# Altium footprint library Evaluation Board.PcbLib: 121 footprints (part 5 of 8)
Each footprint in its own frame and in the unit in brackets; x right, y up, seen from the top. Pads: shape width x height; smd on the part's side, far side on the other; paste and mask are expansions set on the pad; w line width, h text height; cw(c..) or ccw(c..) is an arc to the next point about the centre after c.
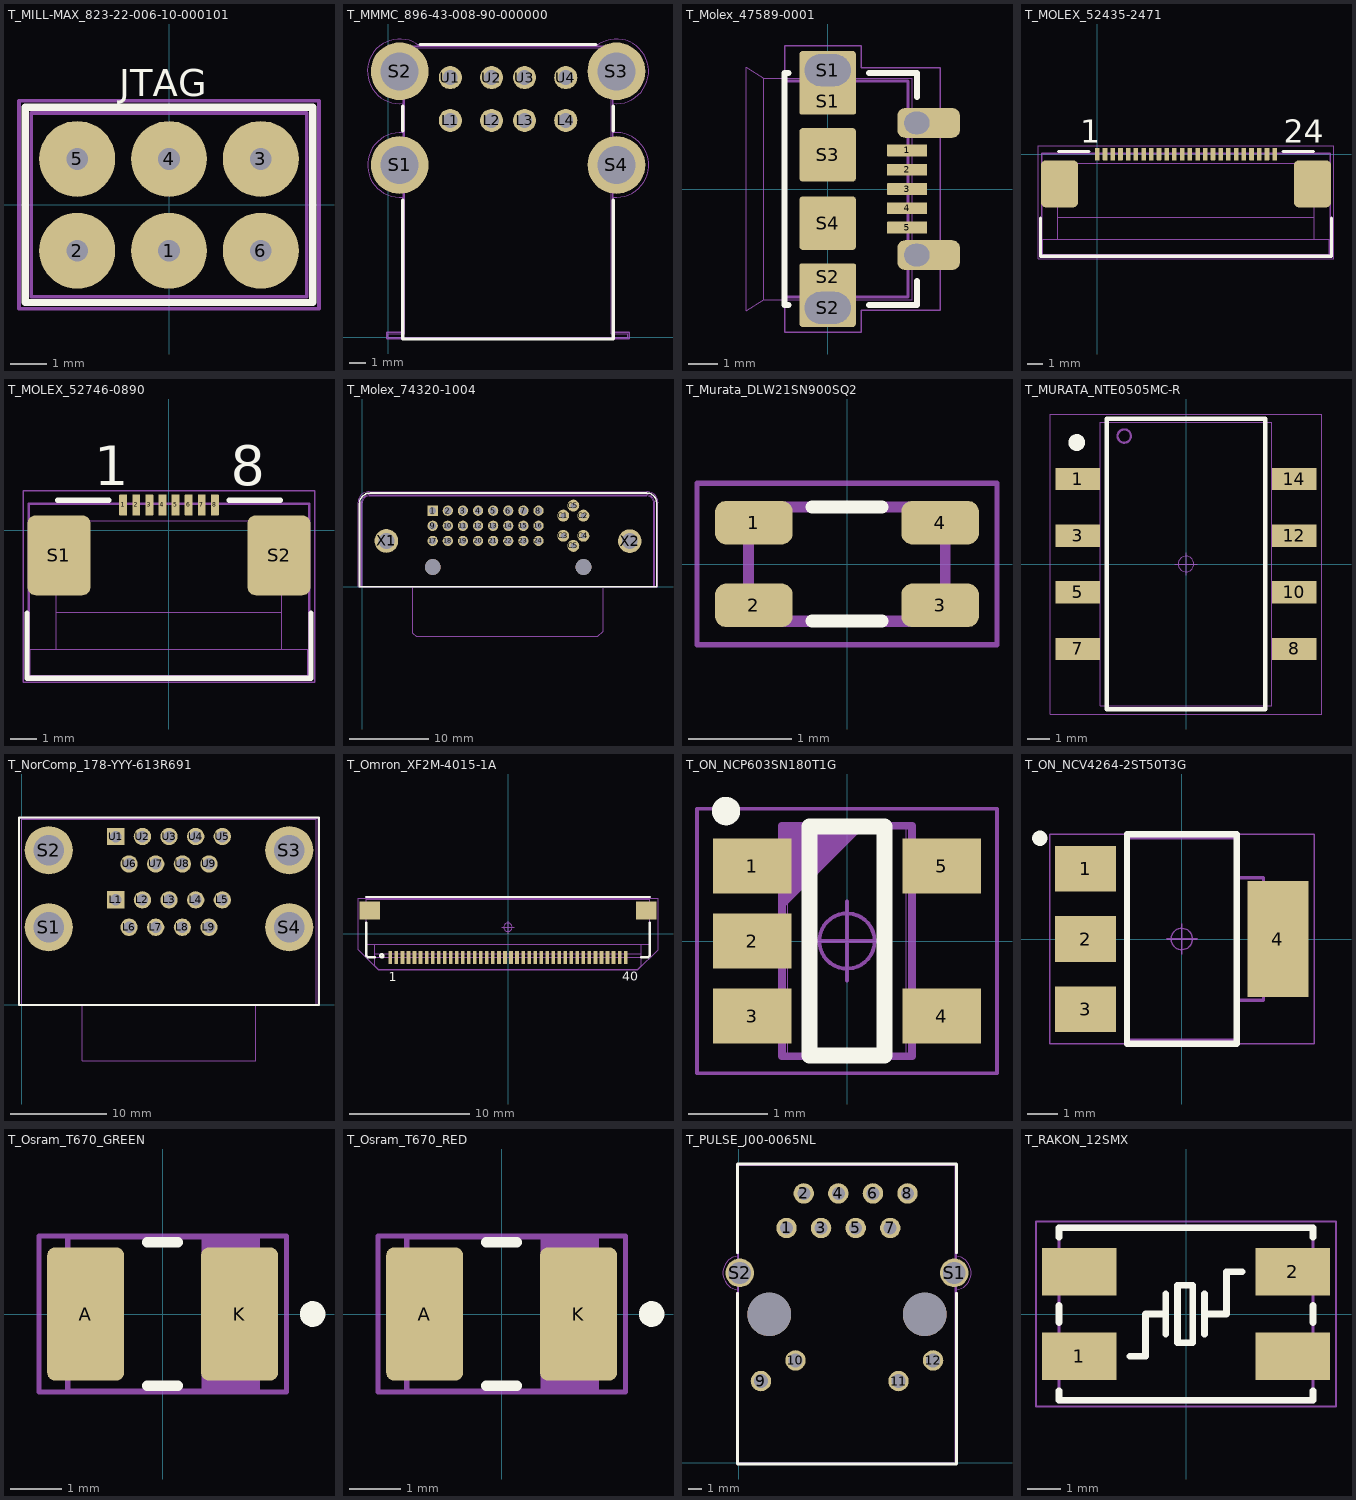
[diagram p4: the footprints below, top view; thin cyan lines are the x and y axes]

## T_MILL-MAX_823-22-006-10-000101 [mm] "Pogo Pins"
height 3.48
pads (6):
  round 2.1 hole 0.6: 1(0,-1.27) 2(-2.54,-1.27) 3(2.54,1.27) 4(0,1.27) 5(-2.54,1.27) 6(2.54,-1.27)
Top Overlay:
  lines w0.2: -3.975,-2.7 -3.975,2.7 3.975,2.7 3.975,-2.7 -3.975,-2.7
  text "JTAG" at -1.375,3 h0.75
Mechanical 1:
  lines w0.1: -4.15,-2.875 -4.15,2.875 4.15,2.875 4.15,-2.875 -4.15,-2.875
Mechanical 2:
  lines w0.001: -3.81,-2.54 -3.81,2.54 3.81,2.54 3.81,-2.54 -3.81,-2.54
Mechanical 3:
  lines w0.1: -3.81,-2.54 -3.81,2.54 3.81,2.54 3.81,-2.54 -3.81,-2.54
3D body: height 3.5, standoff -1.74, extent -3.81,-2.54 3.81,2.54

## T_MMMC_896-43-008-90-000000 [mm] "USB 2.0 double row, Type A"
height 15.6
pads (12):
  round 1.4 hole 0.9: L1(3.75,13.13) L2(6.25,13.13) L3(8.25,13.13) L4(10.75,13.13) U1(3.75,15.73) U2(6.25,15.73) U3(8.25,15.73) U4(10.75,15.73)
  round 3.5 hole 2.3: S1(0.68,10.43) S2(0.68,16.11) S3(13.82,16.11) S4(13.82,10.43)
Top Overlay:
  lines w0.2: 0.875,8.3 0.875,-0.12 13.625,-0.12 13.625,8.3 ; 0.875,12.5 0.875,14 ; 1.91,17.73 12.58,17.73 ; 13.625,12.5 13.625,14
Mechanical 1:
  lines w0.05: 0.901,8.484 0.901,0.299 -0.099,0.299 -0.099,-0.099 14.599,-0.099 14.599,0.299 13.599,0.299 13.599,8.485 ; 0.901,12.374 0.901,14.164 ; 0.902,8.484 cw(c0.685,10.429) 0.904,12.374 ; 0.903,14.164 cw(c0.679,16.109) 1.895,17.643 1.91,17.628 12.582,17.628 ; 12.582,17.631 cw(c13.815,16.11) 13.598,14.165 ; 13.599,12.375 13.599,14.165 ; 13.599,12.376 cw(c13.815,10.43) 13.6,8.485
Mechanical 2:
  lines w0.001: 0,0 0,0.2 1,0.2 1,17.53 13.5,17.53 13.5,0.2 14.5,0.2 14.5,0 0,0
Mechanical 3:
  lines w0.1: 0.9,0.299 0.9,17.629 13.599,17.629 13.599,0.299 14.6,0.299 14.6,-0.099 -0.099,-0.099 -0.099,0.299 0.901,0.299
3D body: height 16.17, standoff -3.58, extent -0.45,0 14.95,17.53

## T_Molex_47589-0001 [mm] "Micro USB Connector"
height 2.5
pads (13):
  rrect12% 1.35x0.4 smd: 1(2.675,1.3) 2(2.675,0.65) 3(2.675,0) 4(2.675,-0.65) 5(2.675,-1.3)
  rrect12% 1.9x0.9 smd: S1(0,2.963) S2(0,-2.963)
  rrect12% 1.9x2.1 hole 1.07 slot 1.55 at 0 deg copper offset 0,-0.4: S1(0,4)
  rrect12% 1.9x2.1 hole 1.07 slot 1.55 at 0 deg copper offset 0,0.4: S2(0,-4)
  rrect12% 1.9x1.8 smd: S3(0,1.15) S4(0,-1.15)
  rrect50% 2.1x1 hole 0.75 slot 0.85 at 0 deg copper offset 0.4,0: ""(3,-2.225) ""(3,2.225)
Top Overlay:
  lines w0.2: -1.32,-3.91 -1.45,-3.91 -1.45,3.91 -1.32,3.91 ; 1.397,-3.91 3,-3.91 3,-3.099 ; 1.397,3.91 3,3.91 ; 3.01,3.099 3.01,3.91
Mechanical 1:
  lines w0.05: -1.45,-4.83 -1.45,4.83 1.13,4.83 1.13,4.08 3.79,4.08 3.79,-4.08 1.13,-4.08 1.13,-4.83 -1.45,-4.83
Mechanical 2:
  lines w0.001: -2.15,-3.725 2.85,-3.725 2.85,3.725 -2.15,3.725 ; -2.15,-3.725 -2.15,3.725 ; -2.15,-3.725 -2.75,-4.1 -2.75,4.1 -2.15,3.725
Mechanical 3:
  lines w0.1: -1.45,-3.64 2.7,-3.64 2.7,3.64 -1.45,3.64 -1.45,-3.64
3D body: height 2.79, standoff -0.58, extent -2.75,-4.325 3.149,4.325

## T_MOLEX_52435-2471 [mm] "DVI FFC Connector 0.5mm pitch"
height 2
pads (26):
  rrect12% 0.3x0.8 smd: 1(0,0) 2(0.5,0) 3(1,0) 4(1.5,0) 5(2,0) 6(2.5,0) 7(3,0) 8(3.5,0) 9(4,0) 10(4.5,0) 11(5,0) 12(5.5,0) 13(6,0) 14(6.5,0) 15(7,0) 16(7.5,0) 17(8,0) 18(8.5,0) 19(9,0) 20(9.5,0) 21(10,0) 22(10.5,0) 23(11,0) 24(11.5,0)
  rrect25% 2.4x3.05 smd: ""(-2.45,-1.925) ""(13.95,-1.925)
Top Overlay:
  lines w0.2: -3.672,-4.125 -3.672,-6.62 15.175,-6.62 15.175,-4.125 ; -2.5,0.175 -0.55,0.175 ; 12.05,0.175 14,0.175
  text "1" at -1.1,0.75 h1.5
  text "24" at 12.1,0.75 h1.5
Mechanical 1:
  lines w0.05: -3.816,-6.766 15.316,-6.766 15.316,0.543 -3.816,0.543 -3.816,-6.766
Mechanical 2:
  lines w0.001: -2.55,-5.5 -2.55,-0.6 14.05,-0.6 14.05,-5.5 ; -2.55,-4.1 14.05,-4.1 ; -3.55,-6.5 -3.55,-5.5 15.05,-5.5 15.05,-6.5 -3.55,-6.5
Mechanical 3:
  lines w0.1: -3.61,-6.558 -3.61,0.044 15.109,0.044 15.109,-6.558 -3.61,-6.558

## T_MOLEX_52746-0890 [mm] "JTAG FFC Connector 0.5mm pitch"
height 2
pads (10):
  rrect12% 0.3x0.8 smd: 1(-1.75,0.962) 2(-1.25,0.962) 3(-0.75,0.962) 4(-0.25,0.962) 5(0.25,0.962) 6(0.75,0.962) 7(1.25,0.962) 8(1.75,0.962)
  rrect25% 2.4x3.05 smd: S1(-4.2,-0.962) S2(4.2,-0.962)
Top Overlay:
  lines w0.2: -5.422,-3.163 -5.422,-5.657 5.421,-5.657 5.421,-3.163 ; -4.25,1.137 -2.3,1.137 ; 2.3,1.137 4.25,1.137
  text "8" at 2.357,1.717 h1.5
  text "1" at -2.85,1.717 h1.5
Mechanical 1:
  lines w0.05: -5.566,-5.803 -5.566,1.506 5.566,1.506 5.566,-5.803 -5.566,-5.803
Mechanical 2:
  lines w0.001: -4.3,-4.537 -4.3,0.363 4.3,0.363 4.3,-4.537 ; -4.3,-3.137 4.3,-3.137 ; -5.3,-5.537 5.3,-5.537 5.3,-4.537 -5.3,-4.537 -5.3,-5.537
Mechanical 3:
  lines w0.1: -5.36,-5.595 5.36,-5.595 5.36,1.006 -5.36,1.006 -5.36,-5.595
3D body: height 2.02, standoff 0.02, extent -5.05,-5.037 5.05,1.363

## T_Molex_74320-1004 [mm] "DVI-Connectors"
height 12.7
pads (34):
  rect 1.3x1.3 hole 0.9: 1(8.89,9.63)
  round 1.3 hole 0.9: 2(10.8,9.63) 3(12.71,9.63) 4(14.62,9.63) 5(16.53,9.63) 6(18.44,9.63) 7(20.35,9.63) 8(22.26,9.63) 9(8.89,7.72) 10(10.8,7.72) 11(12.71,7.72) 12(14.62,7.72) 13(16.53,7.72) 14(18.44,7.72) 15(20.35,7.72) 16(22.26,7.72) 17(8.89,5.81) 18(10.8,5.81) 19(12.71,5.81) 20(14.62,5.81) 21(16.53,5.81) 22(18.44,5.81) 23(20.35,5.81) 24(22.26,5.81)
  round 1.5 hole 0.7: C1(25.39,9.01) C2(27.94,9.01) C3(25.39,6.46) C4(27.94,6.46) C5(26.665,5.185) C5(26.665,10.285)
  round 3 hole 2: X1(3.04,5.81) X2(33.79,5.785)
  round 2 hole 2 unplated paste+0 mask+0: ""(8.89,2.51) ""(27.94,2.51)
Top Overlay:
  lines w0.2: 0.978,11.866 ccw(c0.978,10.532) -0.356,10.532 -0.356,0 37.181,0 37.181,10.626 ; 0.978,11.868 35.936,11.868 cw(c35.936,10.626) 37.178,10.626
Mechanical 1:
  lines w0.05: -0.545,10.627 cw(c0.873,10.627) 0.873,12.045 ; -0.544,10.631 -0.544,0 37.36,0 37.36,10.64 ; 0.863,12.045 35.96,12.045 ; 35.942,12.044 cw(c35.942,10.626) 37.36,10.626
Mechanical 2:
  lines w0.001: 0,10.67 0,0 36.83,0 ; 0.001,10.65 cw(c0.85,10.65) 0.85,11.499 ; 0.84,11.499 35.968,11.499 cw(c35.968,10.65) 36.816,10.65 ; 6.4,0 6.4,-5.829 6.821,-6.25 29.76,-6.25 30.43,-5.581 ; 30.43,-5.581 30.43,0 ; 36.818,0.052 36.818,10.68
Mechanical 3:
  lines w0.1: -0.122,10.635 cw(c0.874,10.635) 0.874,11.63 35.923,11.63 cw(c35.923,10.604) 36.949,10.604 36.949,0 -0.119,0 -0.119,10.626
3D body: height 10.22, standoff -2.93, extent -0.335,-6.25 37.165,11.55

## T_Murata_DLW21SN900SQ2 [mm] "Common Mode Choke"
height 1.2
pads (4):
  rrect50% 0.75x0.42 smd: 1(-0.9,0.4) 2(-0.9,-0.4) 3(0.9,-0.4) 4(0.9,0.4)
Top Overlay:
  lines w0.127: -0.34,-0.55 0.34,-0.55 ; -0.34,0.55 0.34,0.55
Mechanical 1:
  lines w0.05: -1.45,-0.78 1.45,-0.78 1.45,0.78 -1.45,0.78 -1.45,-0.78
Mechanical 2:
  lines w0.001: -1,-0.6 1,-0.6 1,0.6 -1,0.6 -1,-0.6
Mechanical 3:
  lines w0.1: -0.95,-0.55 0.95,-0.55 0.95,0.55 -0.95,0.55 -0.95,-0.55
3D body: height 1.2, standoff 0, extent -1,-0.6 1,0.6

## T_MURATA_NTE0505MC-R [mm] "Isolated DC/DC converter"
height 6.6
pads (8):
  rect 2x1 smd: 1(-4.85,3.81) 3(-4.85,1.27) 5(-4.85,-1.27) 7(-4.85,-3.81) 8(4.85,-3.81) 10(4.85,-1.27) 12(4.85,1.27) 14(4.85,3.81)
Top Overlay:
  circle w0.5: c-4.905,5.45 r0.125
  lines w0.2: -3.56,-6.51 -3.56,6.51 3.56,6.51 3.56,-6.51 -3.56,-6.51
Mechanical 1:
  circle w0.05: c0,0 r0.35
  lines w0.05: -0.5,0 0.5,0 ; 0,-0.5 0,0.5 ; -6.08,-6.73 -6.08,6.73 6.08,6.73 6.08,-6.73 -6.08,-6.73
Mechanical 2:
  lines w0.001: -3.85,-6.35 -3.85,6.35 3.85,6.35 3.85,-6.35 -3.85,-6.35
Mechanical 3:
  circle w0.1: c-2.77,5.74 r0.3
  lines w0.1: -3.56,-6.51 3.56,-6.51 3.56,6.51 -3.56,6.51 -3.56,-6.51
3D body: height 6.6, standoff 0, extent -3.85,-6.35 3.85,6.35

## T_NorComp_178-YYY-613R691 [mm] "0.750 Center Dual Port D-Sub - Male over Male"
height 31.75
pads (22):
  rect 1.8x1.8 hole 1.2: L1(9.754,10.922) U1(9.754,17.501)
  round 1.8 hole 1.2: L2(12.522,10.922) L3(15.291,10.922) L4(18.059,10.922) L5(20.828,10.922) L6(11.138,8.077) L7(13.906,8.077) L8(16.675,8.077) L9(19.444,8.077) U2(12.522,17.501) U3(15.291,17.501) U4(18.059,17.501) U5(20.828,17.501) U6(11.138,14.656) U7(13.906,14.656) U8(16.675,14.656) U9(19.444,14.656)
  round 5 hole 3.2: S1(2.794,8.077) S2(2.794,16.078) S3(27.788,16.078) S4(27.788,8.077)
Top Overlay:
  lines w0.2: -0.3,0 -0.3,19.5 30.875,19.5 30.875,0 -0.3,0
Mechanical 1:
  lines w0.05: -0.213,0 -0.213,19.417 30.802,19.417 30.802,0 -0.213,0
Mechanical 2:
  lines w0.001: -0.002,0 30.58,0 ; 0,0 0,19.31 30.582,19.31 30.582,0 ; 6.291,0 6.291,-5.791 24.291,-5.791 24.291,0
Mechanical 3:
  lines w0.1: -0.216,0 -0.216,19.413 30.802,19.413 30.802,0 -0.216,0
3D body: height 31.79, standoff -3.16, extent -0.114,-6.096 30.696,19.304

## T_Omron_XF2M-4015-1A [mm] "DVI FFC Connector 0.5mm pitch"
height 2
pads (42):
  rect 0.3x1.1 smd: 1(-9.75,-1.95) 2(-9.25,-1.95) 3(-8.75,-1.95) 4(-8.25,-1.95) 5(-7.75,-1.95) 6(-7.25,-1.95) 7(-6.75,-1.95) 8(-6.25,-1.95) 9(-5.75,-1.95) 10(-5.25,-1.95) 11(-4.75,-1.95) 12(-4.25,-1.95) 13(-3.75,-1.95) 14(-3.25,-1.95) 15(-2.75,-1.95) 16(-2.25,-1.95) 17(-1.75,-1.95) 18(-1.25,-1.95) 19(-0.75,-1.95) 20(-0.25,-1.95) 21(0.25,-1.95) 22(0.75,-1.95) 23(1.25,-1.95) 24(1.75,-1.95) 25(2.25,-1.95) 26(2.75,-1.95) 27(3.25,-1.95) 28(3.75,-1.95) 29(4.25,-1.95) 30(4.75,-1.95) 31(5.25,-1.95) 32(5.75,-1.95) 33(6.25,-1.95) 34(6.75,-1.95) 35(7.25,-1.95) 36(7.75,-1.95) 37(8.25,-1.95) 38(8.75,-1.95) 39(9.25,-1.95) 40(9.75,-1.95)
  rect 1.7x1.5 smd: ""(-11.45,1.95) ""(11.45,1.95)
Top Overlay:
  circle w0.2: c-10.459,-1.819 r0.125
  lines w0.2: -11.752,0.919 -11.752,-1.798 -11.6,-1.95 -11.05,-1.95 ; -11.752,3.057 11.75,3.057 ; 11.05,-1.95 11.6,-1.95 11.75,-1.8 11.75,0.917
  text "1" at -9.885,-3.908 h0.75
  text "40" at 9.46,-3.899 h0.75
Mechanical 1:
  circle w0.05: c0,0.55 r0.35
  lines w0.05: -0.5,0.55 0.5,0.55 ; 0,0.05 0,1.05 ; -12.436,-1.303 -12.436,2.95 12.436,2.95 12.436,-1.304 10.762,-2.978 -10.761,-2.978 -12.436,-1.303
Mechanical 2:
  lines w0.001: -11.75,-0.85 11.75,-0.85 ; -11.05,-1.95 -11.6,-1.95 -11.75,-1.8 -11.75,1.45 -12.05,1.45 -12.05,2.55 -11.75,2.55 -11.75,2.95 11.75,2.95 11.75,2.55 12.05,2.55 12.05,1.45 11.75,1.45 11.75,-1.8 11.6,-1.95 11.05,-1.95 ; -11.05,-1.65 11.05,-1.65 ; -11.05,-0.85 -11.05,-2.65 -10.75,-2.95 10.75,-2.95 11.05,-2.65 11.05,-0.85
Mechanical 3:
  lines w0.1: -11.752,-1.798 -11.752,2.884 11.75,2.884 11.75,-1.8 11.6,-1.95 -11.6,-1.95 -11.752,-1.798

## T_ON_NCP603SN180T1G [mm] "SOT 23"
height 1.1
pads (5):
  rect 1x0.7 smd: 1(-1.2,0.95) 2(-1.2,0) 3(-1.2,-0.95) 4(1.2,-0.95) 5(1.2,0.95)
Top Overlay:
  circle w0.2: c-1.533,1.646 r0.08
  lines w0.2: -0.475,-1.45 0.475,-1.45 0.475,1.45 -0.475,1.45 -0.475,-1.45
Mechanical 1:
  circle w0.05: c0,0 r0.35
  lines w0.05: -0.5,0 0.5,0 ; 0,-0.5 0,0.5 ; -1.9,-1.675 1.9,-1.675 1.9,1.675 -1.9,1.675 -1.9,-1.675
Mechanical 2:
  lines w0.001: -0.75,-1.5 0.75,-1.5 0.75,1.5 -0.75,1.5 -0.75,-1.5
Mechanical 3:
  lines w0.1: -0.825,0.46 0.175,1.46 ; -0.825,0.56 0.075,1.46 ; -0.825,0.66 -0.025,1.46 ; -0.825,0.76 -0.125,1.46 ; -0.825,0.86 -0.225,1.46 ; -0.825,0.96 -0.325,1.46 ; -0.825,1.06 -0.425,1.46 ; -0.825,1.16 -0.525,1.46 ; -0.825,1.26 -0.625,1.46 ; -0.825,1.36 -0.725,1.46 ; -0.825,-1.46 0.825,-1.46 0.825,1.46 -0.825,1.46 -0.825,-1.46
3D body: height 1.1, standoff 0, extent -0.75,-1.5 0.75,1.5

## T_ON_NCV4264-2ST50T3G [mm] "SO4"
height 1.8
pads (4):
  rect 2x1.5 smd: 1(-3.15,2.3) 2(-3.15,0) 3(-3.15,-2.3)
  rect 2x3.8 smd: 4(3.15,0)
Top Overlay:
  circle w0.25: c-4.65,3.3 r0.125
  lines w0.2: -1.8,-3.43 1.8,-3.43 1.8,3.43 -1.8,3.43 -1.8,-3.43
Mechanical 1:
  circle w0.05: c0,0 r0.35
  lines w0.05: -0.5,0 0.5,0 ; 0,-0.5 0,0.5 ; -4.33,-3.43 4.33,-3.43 4.33,3.43 -4.33,3.43 -4.33,-3.43
Mechanical 2:
  lines w0.001: -1.85,-3.35 -1.85,3.35 1.85,3.35 1.85,-3.35 -1.85,-3.35
Mechanical 3:
  lines w0.1: 1.79,-2.006 2.68,-2.006 2.68,2.006 1.79,2.006 ; -1.79,-3.302 1.79,-3.302 1.79,3.302 -1.79,3.302 -1.79,-3.302
3D body: height 1.75, standoff 0, extent -1.85,-3.35 1.85,3.35

## T_Osram_T670_GREEN [mm] "LED-Osram-T670"
height 2.1
pads (2):
  rrect20% 1.5x2.6 smd: A(-1.5,0) K(1.5,0)
Top Overlay:
  circle w0.25: c2.923,0 r0.125
  lines w0.2: -0.3,-1.4 0.3,-1.4 ; -0.3,1.4 0.3,1.4
Mechanical 1:
  lines w0.1: -2.413,-1.524 -2.413,1.524 2.413,1.524 2.413,-1.524 -2.413,-1.524
Mechanical 2:
  lines w0.001: -1.85,-1.5 -1.85,1.5 1.85,1.5 1.85,-1.5 -1.85,-1.5
Mechanical 3:
  rectangle: 0.762,-1.5 1.85,1.5
  lines w0.1: -1.85,-1.5 1.85,-1.5 1.85,1.5 -1.85,1.5 -1.85,-1.5
3D body: height 2.1, standoff 0, extent -1.85,-1.5 1.85,1.5

## T_Osram_T670_RED [mm] "LED-Osram-T670"
height 2.1
pads (2):
  rrect20% 1.5x2.6 smd: A(-1.5,0) K(1.5,0)
Top Overlay:
  circle w0.25: c2.923,0 r0.125
  lines w0.2: -0.3,-1.4 0.3,-1.4 ; -0.3,1.4 0.3,1.4
Mechanical 1:
  lines w0.1: -2.413,-1.524 2.413,-1.524 2.413,1.524 -2.413,1.524 -2.413,-1.524
Mechanical 2:
  lines w0.001: -1.85,-1.5 -1.85,1.5 1.85,1.5 1.85,-1.5 -1.85,-1.5
Mechanical 3:
  rectangle: 0.762,-1.5 1.85,1.5
  lines w0.1: -1.85,-1.5 1.85,-1.5 1.85,1.5 -1.85,1.5 -1.85,-1.5
3D body: height 2.1, standoff 0, extent -1.85,-1.5 1.85,1.5

## T_PULSE_J00-0065NL [mm] "RJ45 Connector"
height 14.22
pads (16):
  round 1.5 hole 0.95: 1(3.495,17.24) 2(4.765,19.78) 3(6.035,17.24) 4(7.305,19.78) 5(8.575,17.24) 6(9.845,19.78) 7(11.115,17.24) 8(12.385,19.78)
  round 1.5 hole 1.02: 9(1.615,5.99) 10(4.155,7.51) 11(11.725,5.99) 12(14.265,7.51)
  round 2.1 hole 1.63: S1(15.815,13.94) S2(0.065,13.94)
  round 3.2 hole 3.2: ""(2.225,10.89) ""(13.655,10.89)
Top Overlay:
  lines w0.2: -0.102,12.446 -0.102,-0.102 15.983,-0.102 15.983,12.446 ; -0.102,15.418 -0.102,21.942 15.983,21.942 15.983,15.418
Mechanical 1:
  region: 5.81,17.065 5.81,17.415 6.26,17.415 6.26,17.065
  lines w0.05: -0.102,-0.102 -0.102,12.701 cw(c0.064,13.94) -0.101,15.179 -0.102,21.941 15.981,21.941 15.981,15.179 cw(c15.816,13.94) 15.981,12.701 15.981,-0.102 -0.102,-0.102
Mechanical 2:
  lines w0.001: 0,0 15.88,0 15.88,21.84 0,21.84 0,0
Mechanical 3:
  lines w0.1: -0.102,-0.102 15.983,-0.102 15.983,21.941 -0.102,21.941 -0.102,-0.102
3D body: height 13.32, standoff -3.23, extent 0,0 15.88,21.84

## T_RAKON_12SMX [mm] "OSC"
height 1.4
pads (4):
  rect 2.2x1.4 smd: 1(-3.15,-1.25) 2(3.15,1.25) ""(-3.15,1.25) ""(3.15,-1.25)
Top Overlay:
  lines w0.2: -3.75,-2.55 3.75,-2.55 ; -3.75,-2.548 -3.75,-2.269 ; -3.75,-0.25 -3.75,0.25 ; -3.75,2.269 -3.75,2.548 ; -3.75,2.55 3.75,2.55 ; -1.65,-1.25 -1.2,-1.25 ; -0.6,-0.6 -0.6,0.6 ; -0.6,0 -1.2,0 -1.2,-1.25 ; 0.55,-0.6 0.55,0.6 ; 0.55,0 1.2,0 1.2,1.25 1.65,1.25 ; 3.75,-2.548 3.75,-2.269 ; 3.75,-0.25 3.75,0.25 ; 3.75,2.269 3.75,2.548 ; -1.2,-1.25 -1.2,-1.25 ; -0.25,-0.85 -0.25,0.85 0.2,0.85 0.2,-0.85 -0.25,-0.85
Mechanical 1:
  lines w0.05: -4.43,-2.73 4.43,-2.73 4.43,2.73 -4.43,2.73 -4.43,-2.73
Mechanical 2:
  lines w0.001: -3.75,-2.6 3.75,-2.6 3.75,2.6 -3.75,2.6 -3.75,-2.6
Mechanical 3:
  lines w0.1: -3.75,-2.6 3.75,-2.6 3.75,2.6 -3.75,2.6 -3.75,-2.6
3D body: height 1.4, standoff 0, extent -3.75,-2.6 3.75,2.6